# Altium footprint library PcbLib1.PcbLib: 209 footprints (part 10 of 14)
Each footprint in its own frame and in the unit in brackets; x right, y up, seen from the top. Pads: shape width x height; smd on the part's side, far side on the other; paste and mask are expansions set on the pad; w line width, h text height; cw(c..) or ccw(c..) is an arc to the next point about the centre after c.
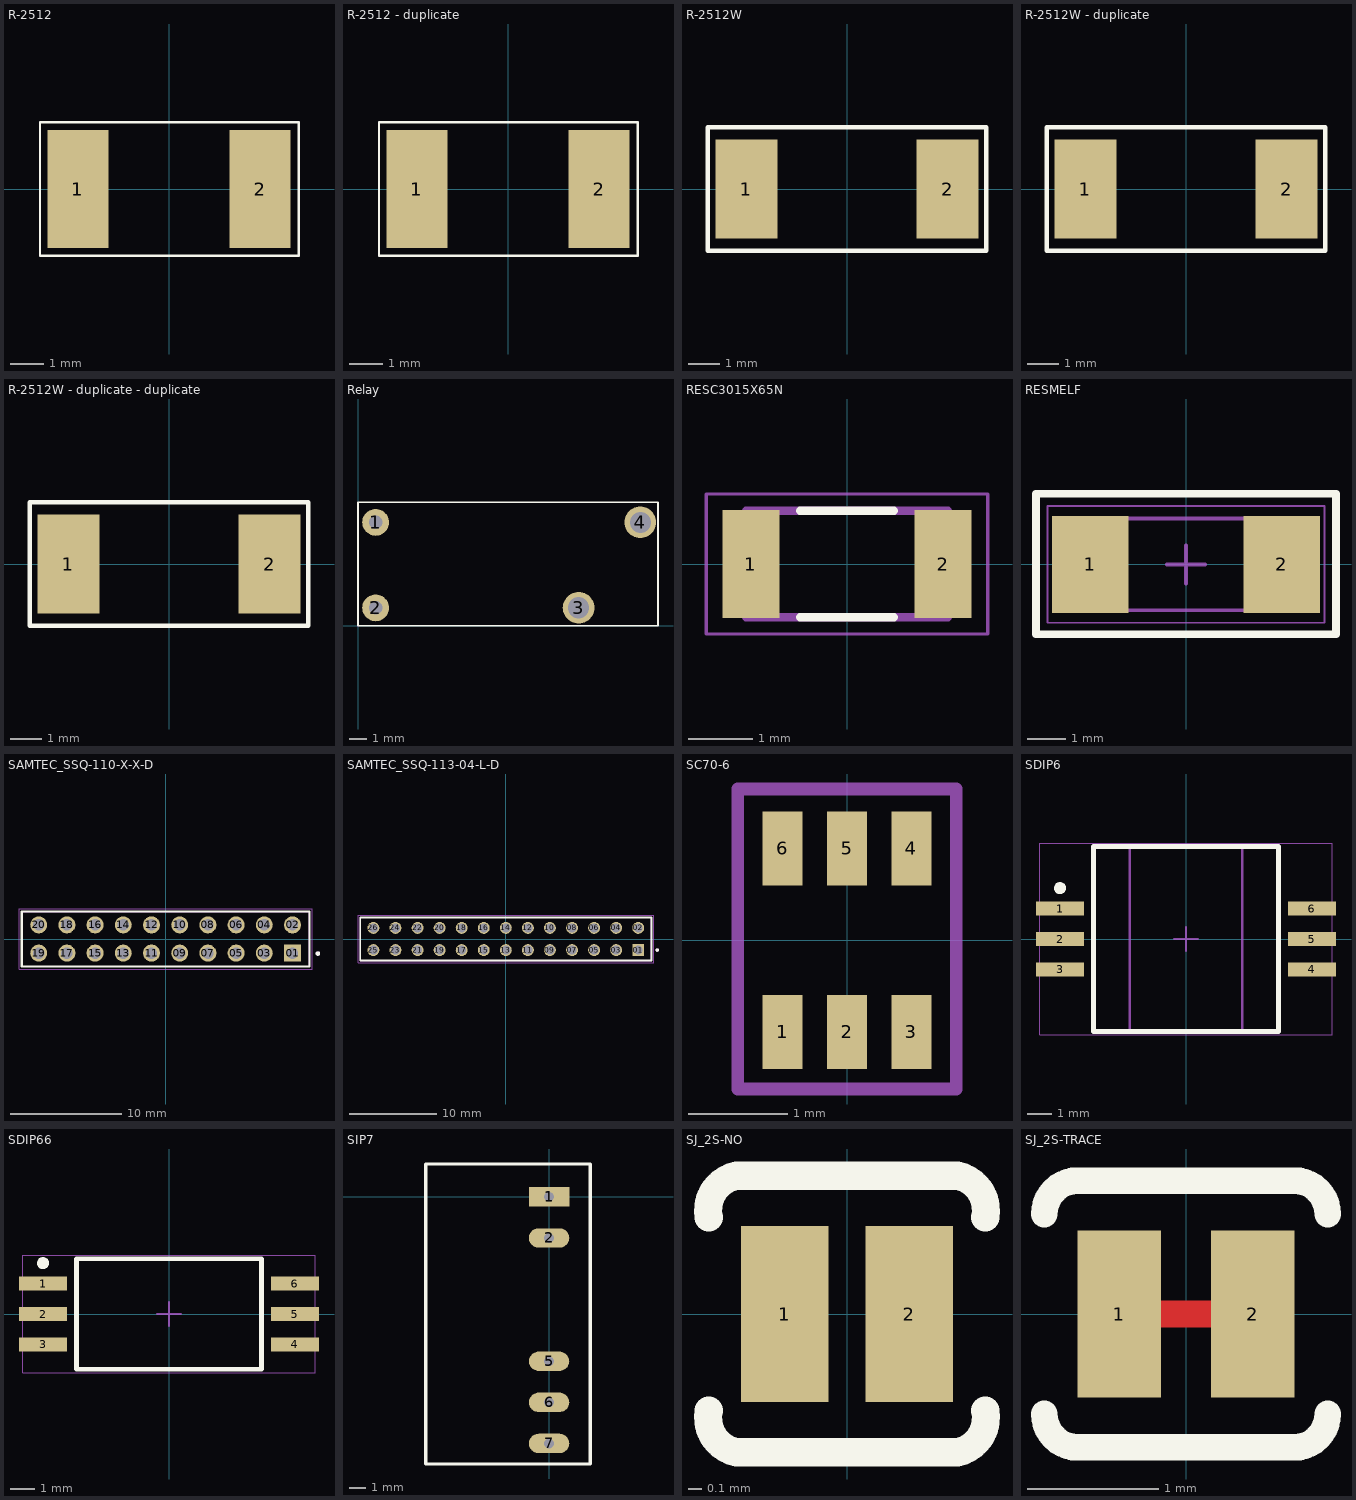
[diagram p9: the footprints below, top view; thin cyan lines are the x and y axes]

## R-2512 [mm]
pads (2):
  rect 1.8x3.5 smd: 1(-2.7,0) 2(2.7,0)
Top Overlay:
  lines w0.07: -3.825,-1.975 -3.825,0.525 -3.825,1.975 3.85,1.975 3.85,-1.975 -3.825,-1.975
3D body "User Library-R SMD 2512.STEP": height 0.59, standoff -0.01, extent -3.206,-1.575 3.094,1.575

## R-2512 - duplicate [mm]
pads (2):
  rect 1.8x3.5 smd: 1(-2.7,0) 2(2.7,0)
Top Overlay:
  lines w0.07: -3.825,-1.975 3.85,-1.975 3.85,1.975 -3.825,1.975 -3.825,0.525 -3.825,-1.975
3D body "User Library-R SMD 2512.STEP": height 0.59, standoff -0.01, extent -3.206,-1.575 3.094,1.575

## R-2512W [mm] "resistor 2512 wave soldering"
pads (2):
  rect 2x3.2 smd: 1(-3.25,0) 2(3.25,0)
Top Overlay:
  lines w0.152: -4.5,-2 -4.5,2 2.15,2 4.5,2 4.5,-2 2.15,-2 -4.5,-2
3D body "res2512.stp": height 0.55, standoff 0, extent -3.15,-1.55 3.15,1.55

## R-2512W - duplicate [mm] "resistor 2512 wave soldering"
pads (2):
  rect 2x3.2 smd: 1(-3.25,0) 2(3.25,0)
Top Overlay:
  lines w0.152: -4.5,-2 2.15,-2 4.5,-2 4.5,2 2.15,2 -4.5,2 -4.5,-2
3D body "res2512.stp": height 0.55, standoff 0, extent -3.15,-1.55 3.15,1.55

## R-2512W - duplicate - duplicate [mm] "resistor 2512 wave soldering"
pads (2):
  rect 2x3.2 smd: 1(-3.25,0) 2(3.25,0)
Top Overlay:
  lines w0.152: -4.5,-2 2.15,-2 4.5,-2 4.5,2 2.15,2 -4.5,2 -4.5,-2
3D body "res2512.stp": height 0.55, standoff 0, extent -3.15,-1.55 3.15,1.55

## Relay [mm]
pads (4):
  round 1.524 hole 0.762: 1(1,5.86) 2(1,1.016)
  round 1.8 hole 1.2: 3(12.5,1.016) 4(16,5.86)
Top Overlay:
  lines w0.1: 0,0 0,7 17,7 17,0 0,0

## RESC3015X65N [mm]
pads (2):
  rect 0.89x1.68 smd: 1(-1.495,0) 2(1.495,0)
Top Overlay:
  lines w0.127: -0.73,-0.83 0.73,-0.83 ; -0.73,0.83 0.73,0.83
Mechanical 13:
  lines w0.127: -1.57,-0.83 -1.57,0.83 1.57,0.83 1.57,-0.83 -1.57,-0.83
Mechanical 15:
  lines w0.05: -2.19,-1.09 -2.19,1.09 2.19,1.09 2.19,-1.09 -2.19,-1.09
3D body "CRCW120647K0FKEAC.STEP": height 0.65, standoff 0, extent -1.587,-0.821 1.463,0.729

## RESMELF [mm] "MELF Resistor, 2-Leads, Body 5.85x2.30mm, IPC Medium Density"
height 2.4
pads (2):
  rect 2x2.55 smd: 1(-2.5,0) 2(2.5,0)
Top Overlay:
  lines w0.2: -3.925,-1.825 -3.925,1.85 -1.572,1.85 -0.191,1.85 2.082,1.85 ; -3.9,-1.825 -1.2,-1.825 3.925,-1.825 3.925,1.85 ; 2.082,1.85 3.925,1.85 ; 2.082,1.85 3.925,1.85
Top Courtyard:
  lines w0.05: -3.625,-1.525 3.625,-1.525 3.625,1.525 -3.625,1.525 -3.625,-1.525
  lines w0.1: -0.5,0 0.5,0 ; 0,-0.5 0,0.5
Top Assembly:
  lines w0.1: -2.95,-1.2 2.95,-1.2 2.95,1.2 -2.95,1.2 -2.95,-1.2
3D body: height 2.39, standoff 0, extent 2.4,-1.2 2.95,1.195
3D body: height 2.39, standoff 0, extent -2.95,-1.2 -2.4,1.195
3D body "User Library-MMB0207_102K.STEP": height 2.4, standoff 0, extent -2.9,-1.2 2.9,1.2

## SAMTEC_SSQ-110-X-X-D [mm]
pads (20):
  rect 1.53x1.53 hole 1.02: 01(11.43,-1.27)
  round 1.53 hole 1.02: 02(11.43,1.27) 03(8.89,-1.27) 04(8.89,1.27) 05(6.35,-1.27) 06(6.35,1.27) 07(3.81,-1.27) 08(3.81,1.27) 09(1.27,-1.27) 10(1.27,1.27) 11(-1.27,-1.27) 12(-1.27,1.27) 13(-3.81,-1.27) 14(-3.81,1.27) 15(-6.35,-1.27) 16(-6.35,1.27) 17(-8.89,-1.27) 18(-8.89,1.27) 19(-11.43,-1.27) 20(-11.43,1.27)
Top Overlay:
  circle w0.2: c13.715,-1.31 r0.1
  lines w0.2: -12.955,-2.475 -12.955,2.475 12.955,2.475 12.955,-2.475 -12.955,-2.475
Mechanical 13:
  circle w0.2: c13.715,-1.31 r0.1
  lines w0.1: -12.955,-2.475 -12.955,2.475 12.955,2.475 12.955,-2.475 -12.955,-2.475
Mechanical 15:
  lines w0.05: -13.205,-2.725 -13.205,2.725 13.205,2.725 13.205,-2.725 -13.205,-2.725
3D body "SSQ-110-24-H-D.stp": height 8.51, standoff -14.83, extent -12.954,-2.476 12.954,2.477

## SAMTEC_SSQ-113-04-L-D [mm]
pads (26):
  rect 1.37x1.37 hole 1.02: 01(15.24,-1.27)
  round 1.37 hole 1.02: 02(15.24,1.27) 03(12.7,-1.27) 04(12.7,1.27) 05(10.16,-1.27) 06(10.16,1.27) 07(7.62,-1.27) 08(7.62,1.27) 09(5.08,-1.27) 10(5.08,1.27) 11(2.54,-1.27) 12(2.54,1.27) 13(0,-1.27) 14(0,1.27) 15(-2.54,-1.27) 16(-2.54,1.27) 17(-5.08,-1.27) 18(-5.08,1.27) 19(-7.62,-1.27) 20(-7.62,1.27) 21(-10.16,-1.27) 22(-10.16,1.27) 23(-12.7,-1.27) 24(-12.7,1.27) 25(-15.24,-1.27) 26(-15.24,1.27)
Top Overlay:
  circle w0.2: c17.415,-1.27 r0.1
  lines w0.2: -16.765,-2.475 16.765,-2.475 16.765,2.475 -16.765,2.475 -16.765,-2.475
Mechanical 13:
  circle w0.2: c17.415,-1.27 r0.1
  lines w0.1: -16.765,-2.475 -16.765,2.475 ; -16.765,-2.475 16.765,-2.475 ; -16.765,-2.475 -16.765,2.475 ; -16.765,2.475 16.765,2.475 ; -16.765,2.475 16.765,2.475 ; 16.765,-2.475 16.765,2.475 ; 16.765,-2.475 16.765,2.475
Mechanical 15:
  lines w0.05: -17.015,-2.725 17.015,-2.725 17.015,2.725 -17.015,2.725 -17.015,-2.725
3D body "SSQ-113-04-L-D.stp": height 8.51, standoff -14.83, extent -16.764,-2.502 16.764,2.452

## SC70-6 [mm] "SC70-6"
pads (6):
  rect 0.4x0.75 smd paste+0: 1(-0.65,-0.925) 2(0,-0.925) 3(0.65,-0.925) 4(0.65,0.925) 5(0,0.925) 6(-0.65,0.925)
Top Paste:
  region: 0.45,-1.3 0.45,-0.55 0.85,-0.55 0.85,-1.3
  region: -0.201,-1.3 -0.201,-0.55 0.199,-0.55 0.199,-1.3
  region: -0.85,-1.3 -0.85,-0.55 -0.45,-0.55 -0.45,-1.3
  region: -0.85,-1.3 -0.85,-0.55 -0.45,-0.55 -0.45,-1.3
  region: -0.2,0.55 -0.2,1.3 0.2,1.3 0.2,0.55
  region: -0.85,-1.3 -0.85,-0.55 -0.45,-0.55 -0.45,-1.3
  region: 0.45,0.55 0.45,1.3 0.85,1.3 0.85,0.55
  region: -0.85,0.55 -0.85,1.3 -0.45,1.3 -0.45,0.55
Bottom Assembly:
  lines w0.127: -1.1,-1.5 1.1,-1.5 1.1,1.525 -1.1,1.525 -1.1,-1.5
3D body "SC70-6.step": height 1.1, standoff 0, extent -1.025,-1.1 0.975,1

## SDIP6 [mm]
height 2.65
pads (6):
  rect 2x0.6 smd: 1(-5.25,1.27) 2(-5.25,0) 3(-5.25,-1.27) 4(5.25,-1.27) 5(5.25,0) 6(5.25,1.27)
Top Overlay:
  circle w0.25: c-5.25,2.12 r0.125
  lines w0.2: -3.85,-3.85 -3.85,3.85 3.85,3.85 3.85,-3.85 -3.85,-3.85
Top Courtyard:
  lines w0.05: -6.1,-4 6.1,-4 6.1,4 -6.1,4 -6.1,-4
  lines w0.1: -0.5,0 0.5,0 ; 0,-0.5 0,0.5
Top Assembly:
  lines w0.1: -2.35,-3.85 2.35,-3.85 2.35,3.85 -2.35,3.85 -2.35,-3.85
3D body: height 2.65, standoff 0, extent -2.35,-3.85 2.35,3.85

## SDIP66 [mm]
height 2.65
pads (6):
  rect 2x0.6 smd: 1(-5.25,1.27) 2(-5.25,0) 3(-5.25,-1.27) 4(5.25,-1.27) 5(5.25,0) 6(5.25,1.27)
Top Overlay:
  circle w0.25: c-5.25,2.12 r0.125
  lines w0.2: -3.85,-2.3 3.85,-2.3 3.85,2.3 -3.85,2.3 -3.85,-2.3
Top Courtyard:
  lines w0.05: -6.1,-2.45 -6.1,2.45 6.1,2.45 6.1,-2.45 -6.1,-2.45
  lines w0.1: -0.5,0 0.5,0 ; 0,-0.5 0,0.5
Top Assembly:
  lines w0.1: -3.85,-2.3 -3.85,2.3 3.85,2.3 3.85,-2.3 -3.85,-2.3
3D body: height 2.65, standoff 0, extent -3.85,-2.3 3.85,2.3

## SIP7 [mm]
pads (5):
  rect 2.5x1.2 hole 0.6: 1(0,0)
  oval 2.5x1.2 hole 0.6: 2(0,-2.54) 5(0,-10.16) 6(0,-12.7) 7(0,-15.24)
Top Overlay:
  lines w0.2: -7.616,-16.51 -7.616,2.032 2.54,2.032 2.54,-16.51 -7.616,-16.51
3D body "mps_dcdc_mgj2d_sc_a.step": height 11.66, standoff -4.94, extent -7.239,-17.243 2.581,2.257

## SJ_2S-NO [mm] "SJ_2S-NO"
pads (2):
  rect 0.635x1.27 smd paste+0: 1(-0.45,0) 2(0.45,0)
Top Overlay:
  lines w0.203: -1,-0.7 ccw(c-0.75,-0.75) -0.8,-1 0.8,-1 ccw(c0.75,-0.75) 1,-0.7 ; -1,0.7 cw(c-0.75,0.75) -0.8,1 0.8,1 cw(c0.75,0.75) 1,0.7

## SJ_2S-TRACE [mil] "SJ_2S-TRACE"
pads (2):
  rect 25x50 smd paste+0: 1(-20,0) 2(20,0)
Top Layer:
  lines w8: -15,0 15,0
Top Overlay:
  lines w8: -42.5,-30 ccw(c-32.5,-30) -32.5,-40 32.5,-40 ccw(c32.5,-30) 42.5,-30 ; -42.5,30 cw(c-32.5,30) -32.5,40 32.5,40 cw(c32.5,30) 42.5,30